# Altium footprint library 自建库.PcbLib: 169 footprints (part 3 of 11)
Each footprint in its own frame and in the unit in brackets; x right, y up, seen from the top. Pads: shape width x height; smd on the part's side, far side on the other; paste and mask are expansions set on the pad; w line width, h text height; cw(c..) or ccw(c..) is an arc to the next point about the centre after c.
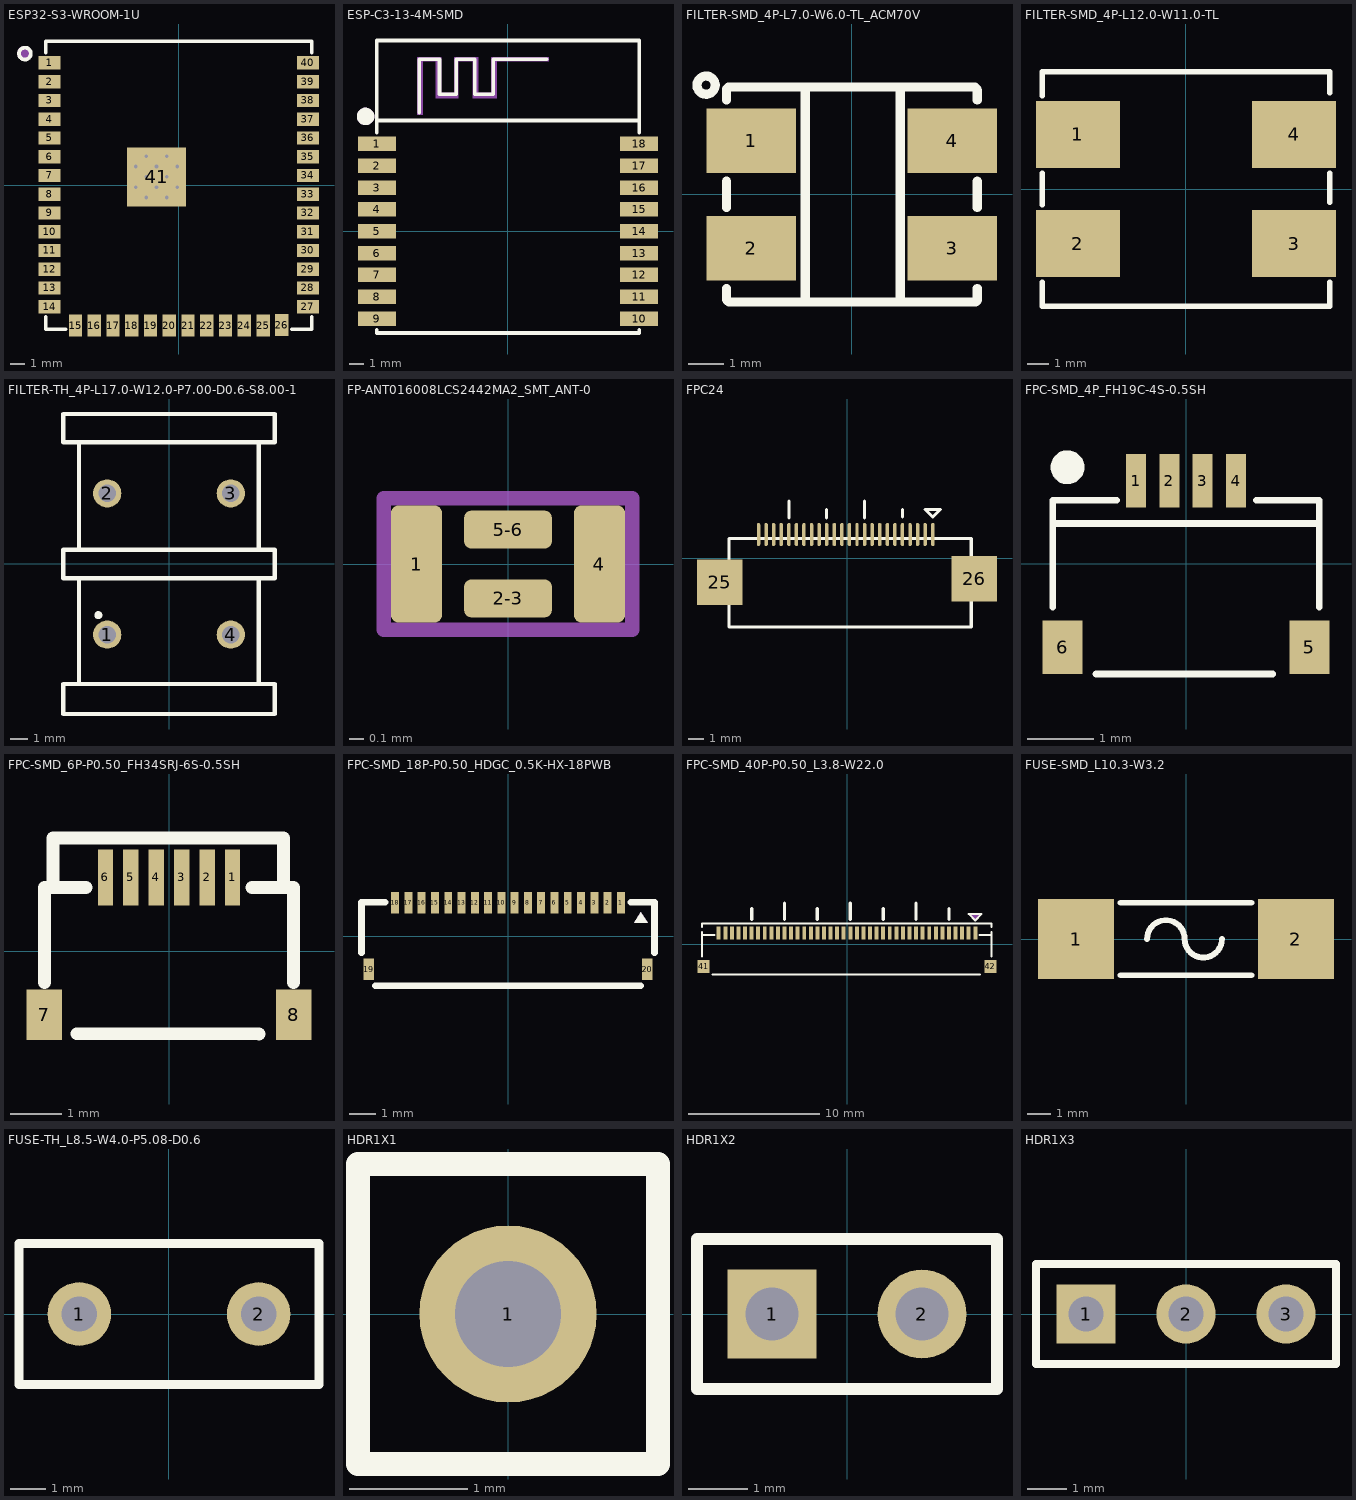
[diagram p2: the footprints below, top view; thin cyan lines are the x and y axes]

## ESP32-S3-WROOM-1U [mm]
pads (41):
  rect 1.5x0.9 smd: 1(-8.759,8.289) 2(-8.759,7.019) 3(-8.759,5.749) 4(-8.759,4.479) 5(-8.759,3.209) 6(-8.759,1.939) 7(-8.759,0.669) 8(-8.759,-0.601) 9(-8.759,-1.871) 10(-8.759,-3.141) 11(-8.759,-4.411) 12(-8.759,-5.681) 13(-8.759,-6.951) 14(-8.759,-8.221) 27(8.741,-8.221) 28(8.741,-6.951) 29(8.741,-5.681) 30(8.741,-4.411) 31(8.741,-3.141) 32(8.741,-1.871) 33(8.741,-0.601) 34(8.741,0.669) 35(8.741,1.939) 36(8.741,3.209) 37(8.741,4.479) 38(8.741,5.749) 39(8.741,7.019) 40(8.741,8.289)
  rect 0.9x1.5 smd: 15(-6.994,-9.501) 16(-5.724,-9.501) 17(-4.454,-9.501) 18(-3.184,-9.501) 19(-1.914,-9.501) 20(-0.644,-9.501) 21(0.626,-9.501) 22(1.896,-9.501) 23(3.166,-9.501) 24(4.436,-9.501) 25(5.706,-9.501) 26(6.976,-9.471)
  rect 4x4 smd: 41(-1.509,0.569)
via -2.209,-0.831 diameter 0.4 hole 0.25
via -2.209,0.569 diameter 0.4 hole 0.25
via -2.909,1.269 diameter 0.4 hole 0.25
via -2.909,-0.131 diameter 0.4 hole 0.25
via -0.809,-0.831 diameter 0.4 hole 0.25
via -0.809,0.569 diameter 0.4 hole 0.25
via -0.109,1.269 diameter 0.4 hole 0.25
via -0.109,-0.131 diameter 0.4 hole 0.25
via -1.509,-0.131 diameter 0.4 hole 0.25
via -1.509,1.269 diameter 0.4 hole 0.25
via -0.809,1.969 diameter 0.4 hole 0.25
via -2.209,1.969 diameter 0.4 hole 0.25
Top Overlay:
  circle w0.254: c-10.423,8.919 r0.402
  lines w0.254: -9.009,-8.902 -9.009,-9.75 -7.675,-9.75 ; -9.009,8.97 -9.009,9.75 9.008,9.75 9.008,8.97 ; 7.658,-9.75 9.008,-9.75 9.008,-8.902
Mechanical 15:
  circle w0.5: c-10.445,8.929 r0.25
3D body "ESP32-S3-WROOM-1U.stp": height 3.1, standoff 0, extent -9.009,-9.75 8.991,9.75

## ESP-C3-13-4M-SMD [mm]
pads (18):
  rect 2.6x1 smd: 1(-9,6) 2(-9,4.5) 3(-9,3) 4(-9,1.5) 5(-9,0) 6(-9,-1.5) 7(-9,-3) 8(-9,-4.5) 9(-9,-6) 10(9,-6) 11(9,-4.5) 12(9,-3) 13(9,-1.5) 14(9,0) 15(9,1.5) 16(9,3) 17(9,4.5) 18(9,6)
Top Overlay:
  circle w0.6: c-9.779,7.884 r0.3
  lines w0.254: -9.017,-6.781 -9.017,-6.985 9.017,-6.985 9.017,-6.781 ; -9.017,6.781 -9.017,13.1 -1.253,13.1 9.017,13.1 ; -9.017,7.606 9.017,7.606 ; -6.096,8.128 -6.096,11.811 -4.699,11.811 -4.699,9.398 -3.556,9.398 -3.556,11.811 -2.286,11.811 -2.286,9.398 -1.016,9.398 -1.016,11.811 0.254,11.811 2.667,11.811 ; 9.017,6.781 9.017,13.081
Mechanical 15:
  circle w0.6: c-9.779,7.884 r0.3
  region: -5.842,8.001 -5.842,11.684 -4.953,11.684 -4.953,9.144 -3.429,9.144 -3.429,11.684 -2.413,11.684 -2.413,9.144 -0.762,9.144 -0.762,11.684 2.794,11.684 2.794,11.938 -1.143,11.938 -1.143,9.525 -2.032,9.525 -2.032,11.938 -3.683,11.938 -3.683,9.525 -4.572,9.525 -4.572,11.938 -6.223,11.938 -6.223,8.001
3D body "ESP32-C3-WROOM-02.STEP": height 3.25, standoff -0.01, extent -9.027,-6.985 8.993,13.015

## FILTER-SMD_4P-L7.0-W6.0-TL_ACM70V [mm]
pads (4):
  rect 2.499x1.8 smd paste+0 mask+0.051: 1(-2.8,1.498) 2(-2.8,-1.498) 3(2.8,-1.498) 4(2.8,1.498)
Top Overlay:
  circle w0.254: c-4.064,3.048 r0.254
  lines w0.254: -3.5,-2.629 -3.5,-2.888 ccw(c-3.388,-2.888) -3.388,-2.999 ; -3.5,-0.367 -3.5,0.367 ; -3.5,2.629 -3.5,2.889 cw(c-3.388,2.889) -3.388,3.001 ; -3.378,-2.997 -1.6,-2.997 1.651,-2.997 3.429,-2.997 ; -3.378,2.998 -1.6,2.998 1.651,2.998 3.378,2.998 ; -1.3,-2.997 -1.3,2.998 ; 1.351,-2.997 1.351,2.998 ; 3.388,3.001 cw(c3.388,2.889) 3.5,2.889 3.5,2.629 ; 3.429,-2.999 ccw(c3.429,-2.928) 3.5,-2.929 3.5,-2.629 ; 3.5,-0.367 3.5,0.367
3D body "C76582.stp": height 3.6, standoff 0, extent -3.5,-3 3.5,3.01

## FILTER-SMD_4P-L12.0-W11.0-TL [mm] "共模滤波器"
pads (4):
  rect 4x3.2 smd: 1(-5.15,2.6) 2(-5.15,-2.6) 3(5.15,-2.6) 4(5.15,2.6)
Top Overlay:
  lines w0.254: -6.858,-4.445 -6.858,-5.588 6.858,-5.588 6.858,-4.445 ; -6.858,-0.762 -6.858,0.762 ; -6.858,4.445 -6.858,5.588 6.858,5.588 6.858,4.572 ; 6.858,-0.635 6.858,0.762
3D body "C250214.stp": height 6.3, standoff 0.3, extent -6,-5.51 6,5.5

## FILTER-TH_4P-L17.0-W12.0-P7.00-D0.6-S8.00-1 [mm]
pads (4):
  round 1.6 hole 1 paste+0 mask+0.051: 1(-3.5,-4) 2(-3.5,4) 3(3.5,4) 4(3.5,-4)
Top Overlay:
  circle w0.254: c-4,-2.9 r0.1
  lines w0.254: -5.1,-6.8 -5.1,-0.8 ; -5.1,0.9 -5.1,6.9 ; 5.098,-6.798 5.098,-0.798 ; 5.098,0.901 5.098,6.901 ; 6,8.4 6,6.9 -6,6.9 -6,8.5 6,8.5 ; -6,-8.5 -6,-7.2 -6,-6.8 6,-6.8 6,-8.5 -6,-8.5 ; -6,-0.8 -6,0.8 6,0.8 6,-0.8 -6,-0.8
3D body "xxx.stp": height 16, standoff -4, extent -6,-8.123 6,8.377

## FP-ANT016008LCS2442MA2_SMT_ANT-0 [mm]
pads (4):
  rrect29% 0.35x0.8 smd paste+0 mask+0.038: 1(-0.625,0) 4(0.625,0)
  rrect38% 0.6x0.26 smd paste+0 mask+0.038: 2-3(0,-0.235) 5-6(0,0.235)
Mechanical 5:
  lines w0.1: -0.85,-0.45 0.85,-0.45 0.85,0.45 -0.85,0.45 -0.85,-0.45
3D body "Ant_ANT016008LCS2442MA2_SMT_ANT.STEP": height 0.25, standoff 0, extent -0.95,-0.55 0.95,0.55

## FPC24 [mm]
pads (26):
  oval 0.23x1.524 smd: 1(5.66,1.575) 2(5.16,1.575) 3(4.66,1.575) 4(4.16,1.575) 5(3.66,1.575) 6(3.16,1.575) 7(2.66,1.575) 8(2.16,1.575) 9(1.66,1.575) 10(1.16,1.575) 11(0.66,1.575) 12(0.16,1.575) 13(-0.34,1.575) 14(-0.84,1.575) 15(-1.34,1.575) 16(-1.84,1.575) 17(-2.34,1.575) 18(-2.84,1.575) 19(-3.34,1.575) 20(-3.84,1.575) 21(-4.34,1.575) 22(-4.84,1.575) 23(-5.34,1.575) 24(-5.84,1.575)
  rect 3x3 smd: 25(-8.4,-1.575) 26(8.4,-1.338)
Top Overlay:
  lines w0.2: -3.84,2.675 -3.84,3.779 ; -1.34,2.675 -1.34,3.225 ; 1.16,2.675 1.16,3.779 ; 3.66,2.725 3.66,3.225 ; -7.79,-4.521 8.2,-4.521 8.2,1.321 -7.79,1.321 -7.79,-4.521 ; 5.16,3.225 5.66,2.725 6.16,3.225 5.16,3.225
3D body "FPC24.stp": height 2, standoff -0.04, extent -8.8,-3.5 8.6,2

## FPC-SMD_4P_FH19C-4S-0.5SH [mm]
pads (6):
  rect 0.3x0.8 smd: 1(-0.75,1.25) 2(-0.25,1.25) 3(0.25,1.25) 4(0.75,1.25)
  rect 0.6x0.8 smd: 5(1.85,-1.25) 6(-1.85,-1.25)
Top Overlay:
  circle w0.254: c-1.778,1.451 r0.127
  lines w0.102: -2,-0.65 -2,0.957 -1.044,0.957 ; -2,0.607 2,0.607 ; -1.35,-1.65 1.3,-1.65 ; 1.059,0.957 2,0.957 2,-0.65
Mechanical 15:
  circle w0.1: c-0.75,1.1 r0.05
3D body "fh34srj-4s-0_5sh_99_.stp": height 1, standoff 0, extent -2,-1.9 2,1.9

## FPC-SMD_6P-P0.50_FH34SRJ-6S-0.5SH [mm]
pads (8):
  rect 0.3x1.1 smd: 1(1.25,1.45) 2(0.75,1.45) 3(0.25,1.45) 4(-0.25,1.45) 5(-0.75,1.45) 6(-1.25,1.45)
  rect 0.7x1 smd: 7(-2.45,-1.25) 8(2.45,-1.25)
Top Overlay:
  lines w0.254: -2.45,-0.619 -2.45,1.25 -1.631,1.25 ; -2.278,1.25 -2.278,2.228 2.25,2.228 2.25,1.25 ; -1.814,-1.624 1.761,-1.624 1.77,-1.633 ; 1.631,1.25 2.45,1.25 2.45,-0.619
3D body "fh34srj-6s-0_5sh_99_.stp": height 1, standoff 0, extent -2.5,-1.9 2.5,1.9

## FPC-SMD_18P-P0.50_HDGC_0.5K-HX-18PWB [mm]
pads (20):
  rect 0.3x0.8 smd paste+0 mask+0.05: 1(4.25,1.25) 2(3.75,1.25) 3(3.25,1.25) 4(2.75,1.25) 5(2.25,1.25) 6(1.75,1.25) 7(1.25,1.25) 8(0.75,1.25) 9(0.25,1.25) 10(-0.25,1.25) 11(-0.75,1.25) 12(-1.25,1.25) 13(-1.75,1.25) 14(-2.25,1.25) 15(-2.75,1.25) 16(-3.25,1.25) 17(-3.75,1.25) 18(-4.25,1.25)
  rect 0.4x0.8 smd paste+0 mask+0.05: 19(-5.25,-1.25) 20(5.25,-1.25)
Top Overlay:
  region: 5.009,0.889 4.755,0.508 5.263,0.508
  lines w0.254: -5.517,-0.629 -5.517,1.27 -4.631,1.27 ; -4.997,-1.873 4.997,-1.873 ; 4.631,1.27 5.517,1.27 5.517,-0.629
Mechanical 15:
  region: 5.009,0.889 4.755,0.508 5.263,0.508
3D body "C2919497.stp": height 1, standoff 0, extent -5.5,-1.895 5.5,1.905

## FPC-SMD_40P-P0.50_L3.8-W22.0 [mm]
pads (42):
  rect 0.3x1 smd: 1(9.75,0.86) 2(9.25,0.86) 3(8.75,0.86) 4(8.25,0.86) 5(7.75,0.86) 6(7.25,0.86) 7(6.75,0.86) 8(6.25,0.86) 9(5.75,0.86) 10(5.25,0.86) 11(4.75,0.86) 12(4.25,0.86) 13(3.75,0.86) 14(3.25,0.86) 15(2.75,0.86) 16(2.25,0.86) 17(1.75,0.86) 18(1.25,0.86) 19(0.75,0.86) 20(0.25,0.86) 21(-0.25,0.86) 22(-0.75,0.86) 23(-1.25,0.86) 24(-1.75,0.86) 25(-2.25,0.86) 26(-2.75,0.86) 27(-3.25,0.86) 28(-3.75,0.86) 29(-4.25,0.86) 30(-4.75,0.86) 31(-5.25,0.86) 32(-5.75,0.86) 33(-6.25,0.86) 34(-6.75,0.86) 35(-7.25,0.86) 36(-7.75,0.86) 37(-8.25,0.86) 38(-8.75,0.86) 39(-9.25,0.86) 40(-9.75,0.86)
  rect 0.9x1 smd: 41(-10.9,-1.685) 42(10.9,-1.685)
Top Overlay:
  lines w0.152: -11.01,-0.925 -11.01,0.7 ; -11.01,0.95 -11.01,0.7 ; -11.01,1.315 -11.01,1.565 11,1.565 11,1.315 ; -10.21,-2.305 10.12,-2.305 ; -10.08,0.7 -11.01,0.7 ; 10.08,0.7 11,0.7 ; 11,-0.945 11,0.7 ; 11,0.95 11,0.7 ; 9.239,2.305 9.739,1.806 10.238,2.305 9.74,2.305 9.239,2.305
  lines w0.254: -7.25,1.905 -7.25,2.705 ; -4.75,1.905 -4.75,3.105 ; -2.25,1.905 -2.25,2.705 ; 0.25,1.905 0.25,3.105 ; 2.75,1.905 2.75,2.705 ; 5.25,1.905 5.25,3.105 ; 7.75,1.905 7.75,2.705
Mechanical 15:
  region: 9.73,1.835 9.27,2.295 10.19,2.295
3D body "fh34srj-40s-0_5sh_99.stp": height 1, standoff 0, extent -11,-1.9 11,1.9

## FUSE-SMD_L10.3-W3.2 [mm] "保险丝"
pads (2):
  rect 3.25x3.43 smd paste+0 mask+0.051: 1(-4.7,0) 2(4.7,0)
Top Overlay:
  lines w0.254: -2.8,-1.55 2.8,-1.55 ; -2.8,1.55 2.8,1.55 ; -1.66,0.005 cw(c-0.86,0.005) -0.06,0.005 ccw(c0.74,0.005) 1.54,0.005
3D body "C553919.stp": height 3.2, standoff 0, extent -5.185,-1.595 5.065,1.605

## FUSE-TH_L8.5-W4.0-P5.08-D0.6 [mm]
pads (2):
  round 1.8 hole 1 paste+0 mask+0.051: 1(-2.54,0) 2(2.54,0)
Top Overlay:
  lines w0.254: -4.25,-2 -4.25,2 4.25,2 4.25,-2 -4.25,-2
3D body "fuse.stp": height 8.5, standoff -3.5, extent -4.25,-2 4.25,2.001

## HDR1X1 [mm] "Connector; Header; 2 Position"
pads (1):
  round 1.5 hole 0.9: 1(0,0)
Top Overlay:
  lines w0.2: -1.27,-1.27 1.27,-1.27 1.27,1.27 -1.27,1.27 -1.27,-1.27
3D body "HDR1X1.STEP": height 6.35, standoff -5.84, extent -1.27,-1.27 1.27,1.27

## HDR1X2 [mm] "Connector; Header; 2 Position"
pads (2):
  rect 1.5x1.5 hole 0.9: 1(-1.27,0)
  round 1.5 hole 0.9: 2(1.27,0)
Top Overlay:
  lines w0.2: -2.54,-1.27 -2.54,1.27 2.54,1.27 2.54,-1.27 -2.54,-1.27
3D body "HDR1X2.STEP": height 6.35, standoff -5.84, extent -2.54,-1.27 2.54,1.27

## HDR1X3 [mm] "Connector; Header; 3 Position"
pads (3):
  rect 1.5x1.5 hole 0.9: 1(-2.54,0)
  round 1.5 hole 0.9: 2(0,0) 3(2.54,0)
Top Overlay:
  lines w0.2: -3.81,-1.27 3.81,-1.27 3.81,1.27 -3.81,1.27 -3.81,-1.27
3D body "HDR1X3.STEP": height 8.38, standoff -3.81, extent -3.81,-1.27 3.81,1.27